# Altium footprint library 全库.PcbLib: 967 footprints (part 24 of 61)
Each footprint in its own frame and in the unit in brackets; x right, y up, seen from the top. Pads: shape width x height; smd on the part's side, far side on the other; paste and mask are expansions set on the pad; w line width, h text height; cw(c..) or ccw(c..) is an arc to the next point about the centre after c.
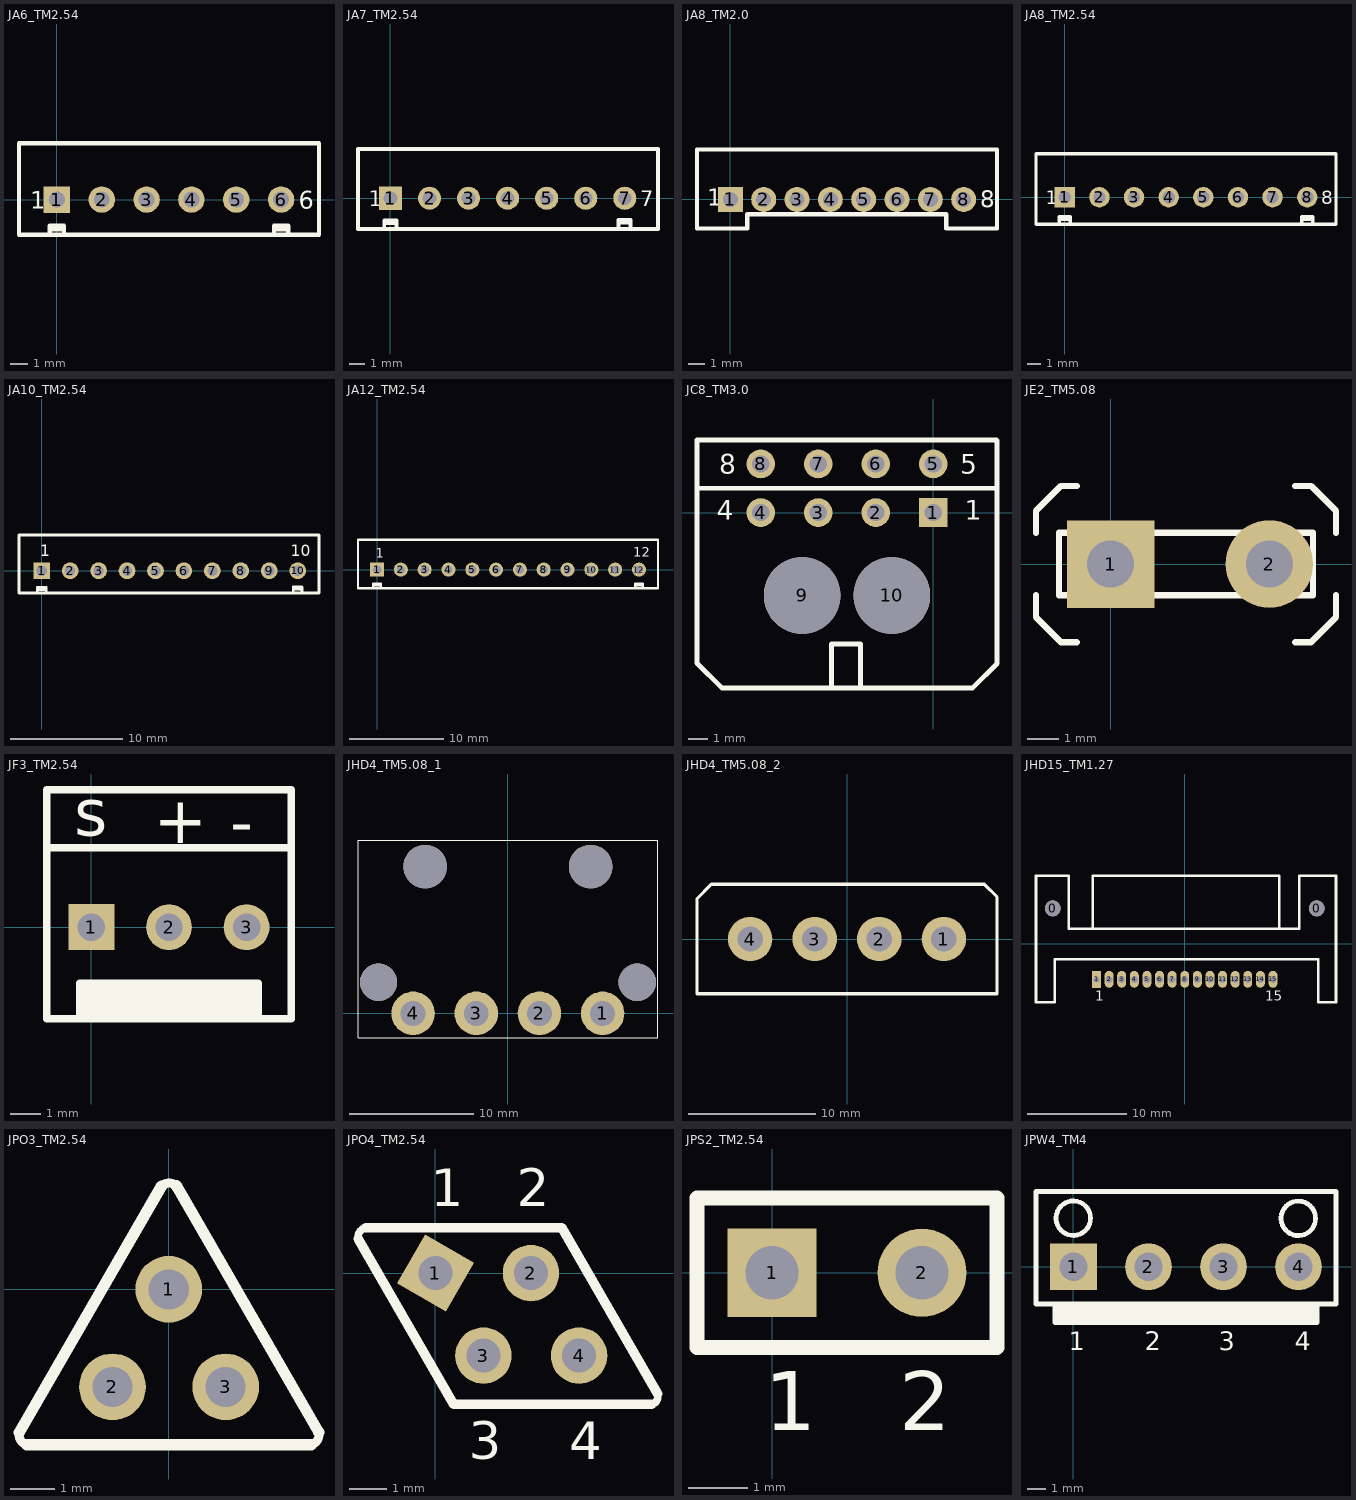
[diagram p23: the footprints below, top view; thin cyan lines are the x and y axes]

## JA6_TM2.54 [mm]
pads (6):
  rect 1.5x1.5 hole 0.9: 1(0,0)
  round 1.5 hole 0.9: 2(2.54,0) 3(5.08,0) 4(7.62,0) 5(10.16,0) 6(12.7,0)
Top Overlay:
  lines w0.254: -0.4,-1.896 -0.4,-1.496 0.4,-1.496 0.4,-1.896 ; -0.4,-1.686 0.4,-1.686 ; 12.3,-1.896 12.3,-1.496 13.1,-1.496 13.1,-1.896 ; 12.3,-1.686 13.1,-1.686 ; -2.15,-2 14.85,-2 14.85,3.2 -2.15,3.2 -2.15,-2
  text "6" at 13.716,-0.508 h1
  text "1" at -1.524,-0.508 h1

## JA7_TM2.54 [mm]
pads (7):
  rect 1.5x1.5 hole 0.9: 1(0,0)
  round 1.5 hole 0.9: 2(2.54,0) 3(5.08,0) 4(7.62,0) 5(10.16,0) 6(12.7,0) 7(15.24,0)
Top Overlay:
  lines w0.254: -0.4,-1.832 -0.4,-1.432 0.4,-1.432 0.4,-1.832 ; -0.4,-1.622 0.4,-1.622 ; 14.821,-1.797 14.821,-1.397 15.621,-1.397 15.621,-1.797 ; 14.821,-1.587 15.621,-1.587 ; -2.11,-2 -2.11,3.2 17.399,3.2 17.399,-2 -2.11,-2
  text "1" at -1.397,-0.508 h1
  text "7" at 16.256,-0.508 h1

## JA8_TM2.0 [mm]
pads (8):
  rect 1.5x1.5 hole 0.9: 1(0,0)
  round 1.5 hole 0.9: 2(2,0) 3(4,0) 4(6,0) 5(8,0) 6(10,0) 7(12,0) 8(14,0)
Top Overlay:
  lines w0.254: -2.002,-1.75 -2,-1.748 ; -2.002,3 -2,2.998 -2,0 -2,-1.748 ; -2,3 12,3 16,3 16,-1.75 12.954,-1.75 12.954,-0.889 1.016,-0.889 1.016,-1.75 ; 1.014,-1.748 -2,-1.748
  text "1" at -1.397,-0.381 h1
  text "8" at 14.986,-0.508 h1

## JA8_TM2.54 [mm]
pads (8):
  rect 1.5x1.5 hole 0.9: 1(0,0)
  round 1.5 hole 0.9: 2(2.54,0) 3(5.08,0) 4(7.62,0) 5(10.16,0) 6(12.7,0) 7(15.24,0) 8(17.78,0)
Top Overlay:
  lines w0.254: -0.4,-1.832 -0.4,-1.432 0.4,-1.432 0.4,-1.832 ; -0.4,-1.622 0.4,-1.622 ; 17.38,-1.832 17.38,-1.432 18.18,-1.432 18.18,-1.832 ; 17.38,-1.622 18.18,-1.622 ; -2.11,-2 -2.11,3.2 19.89,3.2 19.89,-2 -2.11,-2
  text "1" at -1.397,-0.508 h1
  text "8" at 18.796,-0.508 h1

## JA10_TM2.54 [mm]
pads (10):
  rect 1.5x1.5 hole 0.9: 1(0,0)
  round 1.5 hole 0.9: 2(2.54,0) 3(5.08,0) 4(7.62,0) 5(10.16,0) 6(12.7,0) 7(15.24,0) 8(17.78,0) 9(20.32,0) 10(22.86,0)
Top Overlay:
  lines w0.254: -0.4,-1.896 -0.4,-1.496 0.4,-1.496 0.4,-1.896 ; -0.4,-1.686 0.4,-1.686 ; 22.46,-1.861 22.46,-1.461 23.26,-1.461 23.26,-1.861 ; 22.46,-1.651 23.26,-1.651 ; -2.03,-2 -2.03,3.2 24.765,3.2 24.765,-2 -2.03,-2
  text "1" at -0.127,1.27 h1
  text "10" at 22.225,1.27 h1

## JA12_TM2.54 [mm]
pads (12):
  rect 1.5x1.5 hole 0.9: 1(0,0)
  round 1.5 hole 0.9: 2(2.54,0) 3(5.08,0) 4(7.62,0) 5(10.16,0) 6(12.7,0) 7(15.24,0) 8(17.78,0) 9(20.32,0) 10(22.86,0) 11(25.4,0) 12(27.94,0)
Top Overlay:
  lines w0.254: -0.4,-1.896 -0.4,-1.496 0.4,-1.496 0.4,-1.896 ; -0.4,-1.686 0.4,-1.686 ; 27.54,-1.896 27.54,-1.496 28.34,-1.496 28.34,-1.896 ; 27.54,-1.686 28.34,-1.686 ; -2.03,-2 -2.03,3.2 29.97,3.2 29.97,-2 -2.03,-2
  text "1" at -0.127,1.27 h1
  text "12" at 27.305,1.397 h1

## JC8_TM3.0 [mm]
pads (10):
  rect 1.5x1.5 hole 0.9: 1(0,0)
  round 1.5 hole 0.9: 2(-3,0) 3(-6,0) 4(-9,0) 5(0,2.54) 6(-3,2.54) 7(-6,2.54) 8(-9,2.54)
  round 4 hole 4: 9(-6.84,-4.32) 10(-2.16,-4.32)
Top Overlay:
  lines w0.254: -5.316,-9.019 -5.316,-6.86 -3.792,-6.86 -3.792,-9.019 ; -12.325,1.27 3.325,1.27 ; -12.325,1.27 -12.325,-7.749 -12.325,-7.852 -11.031,-9.146 2.055,-9.146 3.325,-7.876 3.325,1.27 ; -12.325,1.27 -12.325,3.784 3.296,3.784 3.325,3.755 3.325,1.27
  text "8" at -11.176,2.032 h1
  text "4" at -11.303,-0.381 h1
  text "1" at 1.651,-0.381 h1
  text "5" at 1.397,2.032 h1

## JE2_TM5.08 [mm]
pads (2):
  rect 2.8x2.8 hole 1.5: 1(0,0)
  round 2.8 hole 1.5: 2(5.08,0)
Top Overlay:
  lines w0.2: -2.387,-1 -2.387,-1.7 ; -2.387,1 -2.387,1.7 ; -1.087,-2.5 -1.587,-2.5 ; -1.087,2.5 -1.587,2.5 ; 5.913,-2.5 6.413,-2.5 ; 5.913,2.5 6.413,2.5 ; 7.213,-1 7.213,-1.7 ; 7.213,1 7.213,1.7 ; -2.387,-1.7 -1.587,-2.5 ; -2.387,-1.7 -1.587,-2.5 ; -2.387,1.7 -1.587,2.5 ; -2.387,1.7 -1.587,2.5 ; 6.413,-2.5 7.213,-1.7 ; 6.413,-2.5 7.213,-1.7 ; 6.413,2.5 7.213,1.7 ; 6.413,2.5 7.213,1.7 ; -1.651,-1 6.477,-1 6.477,1 -1.651,1 -1.651,-1

## JF3_TM2.54 [mm]
pads (3):
  rect 1.5x1.5 hole 0.9: 1(0,0)
  round 1.5 hole 0.9: 2(2.54,0) 3(5.08,0)
Top Overlay:
  region: 5.44,-3 5.44,-1.8 -0.36,-1.8 -0.36,-3
  lines w0.254: -1.46,2.6 6.54,2.6 ; -0.381,-3 -0.381,-1.841 5.461,-1.841 5.461,-3 ; -1.46,-3 6.54,-3 6.54,4.5 -1.46,4.5 -1.46,-3
  text "s" at -0.56,3 h1.52
  text "+" at 2.04,2.75 h1.52
  text "-" at 4.54,2.7 h1.52

## JHD4_TM5.08_1 [mm]
height 5.85
pads (8):
  round 3.5 hole 2: 1(7.62,0) 2(2.54,0) 3(-2.54,0) 4(-7.62,0)
  round 3 hole 3: ""(-10.4,2.5) ""(10.4,2.5)
  round 3.5 hole 3.5: ""(-6.65,11.8) ""(6.65,11.8)
Top Overlay:
  lines w0.1: -12.05,-1.98 12.07,-1.98 12.07,13.93 -12.05,13.93 -12.05,-1.98

## JHD4_TM5.08_2 [mm]
pads (4):
  round 3.5 hole 2: 1(7.62,0) 2(2.54,0) 3(-2.54,0) 4(-7.62,0)
Top Overlay:
  lines w0.254: -11.8,-4.3 -11.8,3.17 -10.67,4.3 10.81,4.3 11.8,3.31 11.8,-4.3 -11.8,-4.3

## JHD15_TM1.27 [mm]
height 0.6
pads (17):
  round 1.6 hole 1.6: 0(-13.3,3.575) 0(13.3,3.575)
  rect 0.9x1.7 hole 0.6: 1(-8.89,-3.575)
  oval 0.9x1.7 hole 0.7: 2(-7.62,-3.575) 3(-6.35,-3.575) 4(-5.08,-3.575) 5(-3.81,-3.575) 6(-2.54,-3.575) 7(-1.27,-3.575) 8(0,-3.575) 9(1.27,-3.575) 10(2.54,-3.575) 11(3.81,-3.575) 12(5.08,-3.575) 13(6.35,-3.575) 14(7.62,-3.575) 15(8.89,-3.575)
Top Overlay:
  lines w0.254: -9.271,1.505 -9.271,6.839 9.525,6.839 9.525,1.505 ; -14.986,-5.861 -13.081,-5.861 -13.081,-1.543 13.462,-1.543 13.462,-5.861 15.24,-5.861 15.24,6.839 11.557,6.839 11.557,1.505 10.668,1.505 -11.684,1.505 -11.684,6.839 -14.986,6.839 -14.986,-5.861
  text "1" at -9.017,-5.734 h1
  text "15" at 8.128,-5.734 h1

## JPO3_TM2.54 [mm]
pads (3):
  round 1.5 hole 0.9: 1(0,0) 2(-1.265,-2.193) 3(1.28,-2.193)
Top Overlay:
  lines w0.2: -3.361,-3.221 ccw(c-3.142,-3.274) -3.195,-3.493 ; -0.161,2.321 cw(c0.006,2.151) 0.176,2.319 ; 3.205,-3.493 ccw(c3.149,-3.271) 3.371,-3.214
  lines w0.254: -3.361,-3.221 -0.161,2.321 ; -3.195,-3.493 3.205,-3.493 ; 0.171,2.328 3.371,-3.214

## JPO4_TM2.54 [mm]
pads (4):
  rect 1.5x1.5 hole 0.9 rot 60: 1(0,0)
  round 1.5 hole 0.9: 2(2.54,0) 3(1.275,-2.193) 4(3.82,-2.193)
Top Overlay:
  lines w0.2: -2.055,0.907 cw(c-1.805,0.957) -1.855,1.207 ; 5.745,-3.493 ccw(c5.689,-3.271) 5.911,-3.214
  lines w0.254: -2.053,0.908 0.488,-3.493 5.745,-3.493 ; -1.855,1.207 3.358,1.207 5.911,-3.214
  text "4" at 3.556,-4.953 h1
  text "3" at 0.889,-4.953 h1
  text "2" at 2.159,1.778 h1
  text "1" at -0.127,1.778 h1

## JPS2_TM2.54 [mm]
pads (2):
  rect 1.5x1.5 hole 0.9: 1(0,0)
  round 1.5 hole 0.9: 2(2.54,0)
Top Overlay:
  lines w0.254: -1.27,-1.27 3.81,-1.27 3.81,1.27 -1.27,1.27 -1.27,-1.27
  text "1" at -0.127,-2.667 h1
  text "2" at 2.159,-2.667 h1

## JPW4_TM4 [mm]
pads (4):
  rect 2.5x2.5 hole 1.5: 1(0,0)
  round 2.5 hole 1.5: 2(4,0) 3(8,0) 4(12,0)
Top Overlay:
  circle w0.254: c-0.01,2.59 r0.92
  circle w0.254: c11.99,2.58 r0.92
  region: 12.99,-3.03 12.99,-2.01 -0.97,-2.01 -0.97,-3.03
  lines w0.254: -1,-2.98 13,-2.98 13,-1.99 13.01,-1.98 ; -0.99,-2.98 -0.99,-1.99 -0.98,-1.98 ; -2,-1.98 -2,4.02 14,4.02 14,-1.98 -2,-1.98
  text "1" at -0.254,-4.445 h1
  text "2" at 3.81,-4.445 h1
  text "3" at 7.747,-4.445 h1
  text "4" at 11.811,-4.445 h1